# Altium footprint library ERNI THD.PcbLib: 27 footprints (part 2 of 3)
Each footprint in its own frame and in the unit in brackets; x right, y up, seen from the top. Pads: shape width x height; smd on the part's side, far side on the other; paste and mask are expansions set on the pad; w line width, h text height; cw(c..) or ccw(c..) is an arc to the next point about the centre after c.
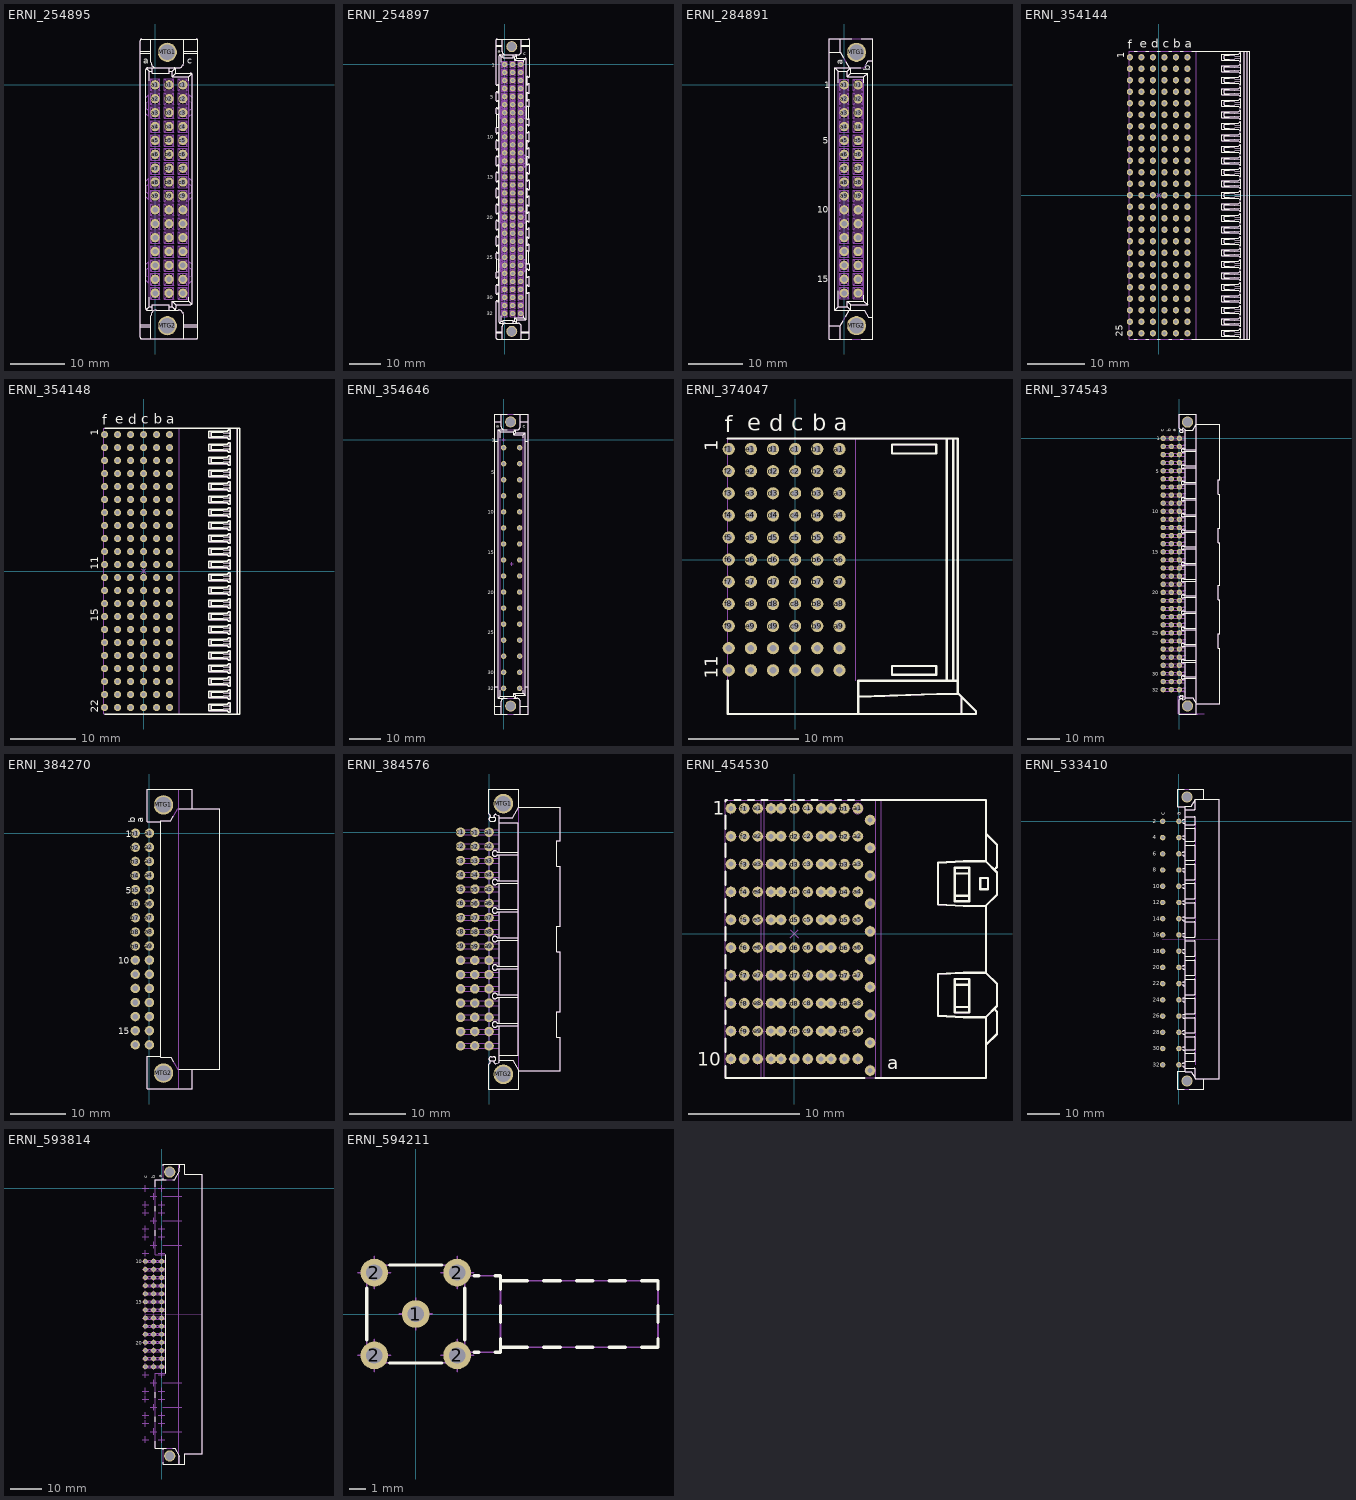
[diagram p1: the footprints below, top view; thin cyan lines are the x and y axes]

## ERNI_254895 [mm] "DIN 41612, Type C/2, Thru-Hole;  Rows a+b+c, 48 Positions, Class 1, Lead 4mm, Pitch 2.54mm, Vertical Female Connector"
height 11.6
pads (50):
  round 1.7 hole 1: a1(0,0) a2(0,-2.54) a3(0,-5.08) a4(0,-7.62) a5(0,-10.16) a6(0,-12.7) a7(0,-15.24) a8(0,-17.78) a9(0,-20.32) a10(0,-22.86) a11(0,-25.4) a12(0,-27.94) a13(0,-30.48) a14(0,-33.02) a15(0,-35.56) a16(0,-38.1) b1(2.54,0) b2(2.54,-2.54) b3(2.54,-5.08) b4(2.54,-7.62) b5(2.54,-10.16) b6(2.54,-12.7) b7(2.54,-15.24) b8(2.54,-17.78) b9(2.54,-20.32) b10(2.54,-22.86) b11(2.54,-25.4) b12(2.54,-27.94) b13(2.54,-30.48) b14(2.54,-33.02) b15(2.54,-35.56) b16(2.54,-38.1) c1(5.08,0) c2(5.08,-2.54) c3(5.08,-5.08) c4(5.08,-7.62) c5(5.08,-10.16) c6(5.08,-12.7) c7(5.08,-15.24) c8(5.08,-17.78) c9(5.08,-20.32) c10(5.08,-22.86) c11(5.08,-25.4) c12(5.08,-27.94) c13(5.08,-30.48) c14(5.08,-33.02) c15(5.08,-35.56) c16(5.08,-38.1)
  round 3.5 / inner round 3.5 / far side round 5.1 hole 2.8: MTG1(2.24,5.95) MTG2(2.24,-44.05)
Top Overlay:
  lines w0.2: -2.71,-44.235 -0.76,-44.235 ; -2.71,-43.882 -0.76,-43.882 ; -2.71,5.784 -0.76,5.784 ; -2.71,6.137 -0.76,6.137 ; -1.597,-41.111 -1.035,-40.549 ; -1.597,3.013 -1.035,2.451 ; -1.035,-38.801 -1.035,-40.549 ; -1.035,0.701 -1.035,2.451 ; -0.76,-46.479 -0.76,-42.199 cw(c0.24,-42.199) 0.24,-41.199 4.24,-41.199 cw(c4.24,-42.199) 5.24,-42.199 5.24,-46.479 ; -0.76,8.381 -0.76,4.101 ccw(c0.24,4.101) 0.24,3.101 ; -0.485,-40.549 -1.035,-40.549 ; -0.485,2.451 -1.035,2.451 ; -0.485,3.103 -0.485,2.101 2.565,2.101 2.565,3.101 ; 2.565,-41.199 2.565,-40.199 -0.485,-40.199 -0.485,-41.199 -1.385,-41.199 cw(c-1.385,-40.899) -1.685,-40.899 -1.685,2.801 cw(c-1.385,2.801) -1.385,3.101 4.24,3.101 ccw(c4.24,4.101) 5.24,4.101 5.24,8.381 ; 2.565,-40.549 3.115,-40.549 ; 2.565,2.451 3.115,2.451 ; 3.465,-41.199 ccw(c3.465,-40.899) 3.765,-40.899 3.765,-40.199 ; 3.465,3.101 cw(c3.465,2.801) 3.765,2.801 3.765,2.101 ; 3.677,-41.111 3.115,-40.549 ; 3.677,3.013 3.115,2.451 ; 5.24,-44.235 7.79,-44.235 ; 5.24,-43.882 7.79,-43.882 ; 5.24,5.784 7.79,5.784 ; 5.24,6.137 7.79,6.137 ; 6.115,-38.801 6.115,-39.549 ; 6.115,0.701 6.115,1.451 ; 6.677,-40.111 6.115,-39.549 ; 6.677,2.013 6.115,1.451 ; 3.115,-40.549 3.115,-39.549 ; 3.115,-39.549 3.765,-40.199 ; 3.115,-39.549 6.115,-39.549 ; 3.115,1.451 3.765,2.101 ; 3.115,1.451 3.115,2.451 ; 3.115,1.451 6.115,1.451 ; 3.765,-40.199 6.465,-40.199 ccw(c6.465,-39.899) 6.765,-39.899 6.765,1.801 ccw(c6.465,1.801) 6.465,2.101 3.765,2.101 ; -2.71,-46.179 ccw(c-2.41,-46.179) -2.41,-46.479 7.49,-46.479 ccw(c7.49,-46.179) 7.79,-46.179 7.79,8.081 ccw(c7.49,8.081) 7.49,8.381 -2.41,8.381 ccw(c-2.41,8.081) -2.71,8.081 -2.71,-46.179
  text "a" at -2.186,3.81 h1.2
  text "c" at 5.915,3.81 h1.2
Mechanical 8:
  drawing of 200 lines, arcs and shapes, not listed
Mechanical 14:
  drawing of 677 lines, arcs and shapes, not listed
  text "a" at -2.186,3.81 h1.2
  text "c" at 5.915,3.81 h1.2
3D body "ERNI_254895.stp": height 11.45, standoff -4, extent -2.71,-46.479 7.79,8.381

## ERNI_254897 [mm] "DIN 41612, Type C,  Thru-Hole; Rows a+b+c, 96 Position, Class 1, Lead 4mm, Pitch 2.54mm, Straight Female Connector"
height 11.6
pads (98):
  round 1.7 hole 1: a1(0,0) a2(0,-2.54) a3(0,-5.08) a4(0,-7.62) a5(0,-10.16) a6(0,-12.7) a7(0,-15.24) a8(0,-17.78) a9(0,-20.32) a10(0,-22.86) a11(0,-25.4) a12(0,-27.94) a13(0,-30.48) a14(0,-33.02) a15(0,-35.56) a16(0,-38.1) a17(0,-40.64) a18(0,-43.18) a19(0,-45.72) a20(0,-48.26) a21(0,-50.8) a22(0,-53.34) a23(0,-55.88) a24(0,-58.42) a25(0,-60.96) a26(0,-63.5) a27(0,-66.04) a28(0,-68.58) a29(0,-71.12) a30(0,-73.66) a31(0,-76.2) a32(0,-78.74) b1(2.54,0) b2(2.54,-2.54) b3(2.54,-5.08) b4(2.54,-7.62) b5(2.54,-10.16) b6(2.54,-12.7) b7(2.54,-15.24) b8(2.54,-17.78) b9(2.54,-20.32) b10(2.54,-22.86) b11(2.54,-25.4) b12(2.54,-27.94) b13(2.54,-30.48) b14(2.54,-33.02) b15(2.54,-35.56) b16(2.54,-38.1) b17(2.54,-40.64) b18(2.54,-43.18) b19(2.54,-45.72) b20(2.54,-48.26) b21(2.54,-50.8) b22(2.54,-53.34) b23(2.54,-55.88) b24(2.54,-58.42) b25(2.54,-60.96) b26(2.54,-63.5) b27(2.54,-66.04) b28(2.54,-68.58) b29(2.54,-71.12) b30(2.54,-73.66) b31(2.54,-76.2) b32(2.54,-78.74) c1(5.08,0) c2(5.08,-2.54) c3(5.08,-5.08) c4(5.08,-7.62) c5(5.08,-10.16) c6(5.08,-12.7) c7(5.08,-15.24) c8(5.08,-17.78) c9(5.08,-20.32) c10(5.08,-22.86) c11(5.08,-25.4) c12(5.08,-27.94) c13(5.08,-30.48) c14(5.08,-33.02) c15(5.08,-35.56) c16(5.08,-38.1) c17(5.08,-40.64) c18(5.08,-43.18) c19(5.08,-45.72) c20(5.08,-48.26) c21(5.08,-50.8) c22(5.08,-53.34) c23(5.08,-55.88) c24(5.08,-58.42) c25(5.08,-60.96) c26(5.08,-63.5) c27(5.08,-66.04) c28(5.08,-68.58) c29(5.08,-71.12) c30(5.08,-73.66) c31(5.08,-76.2) c32(5.08,-78.74)
  round 3.5 / inner round 3.5 / far side round 5.1 hole 2.8: MTG1(2.24,5.63) MTG2(2.24,-84.37)
Top Overlay:
  drawing of 294 lines, arcs and shapes, not listed
  text "a" at -2.151,3.66 h1.2
  text "c" at 5.805,2.935 h1.2
  text "10" at -5.475,-23.46 h1.2
  text "32" at -5.675,-79.365 h1.2
  text "5" at -4.55,-10.835 h1.2
  text "30" at -5.675,-74.285 h1.2
  text "25" at -5.675,-61.585 h1.2
  text "20" at -5.675,-48.885 h1.2
  text "15" at -5.475,-36.135 h1.2
  text "1" at -4.075,-0.675 h1.2
Mechanical 8:
  drawing of 392 lines, arcs and shapes, not listed
Mechanical 14:
  drawing of 1495 lines, arcs and shapes, not listed
  text "a" at -2.151,3.66 h1.2
  text "c" at 5.805,2.935 h1.2
  text "10" at -5.475,-23.46 h1.2
  text "32" at -5.675,-79.365 h1.2
  text "5" at -4.55,-10.835 h1.2
  text "30" at -5.675,-74.285 h1.2
  text "25" at -5.675,-61.585 h1.2
  text "20" at -5.675,-48.885 h1.2
  text "15" at -5.475,-36.135 h1.2
  text "1" at -4.075,-0.675 h1.2
3D body "ERNI_254897.stp": height 11.45, standoff -4, extent -2.71,-86.795 7.79,8.055

## ERNI_284891 [mm] "DIN 41612, Type 2B, Thru-Hole Pressfit Terminations;  Rows a+b, 32 Positions, Performance level 2, Lead 4.5 mm, Pitch 2.54mm, Straight Female Connector"
height 11.6
pads (34):
  round 1.7 hole 1: a1(0,0) a2(0,-2.54) a3(0,-5.08) a4(0,-7.62) a5(0,-10.16) a6(0,-12.7) a7(0,-15.24) a8(0,-17.78) a9(0,-20.32) a10(0,-22.86) a11(0,-25.4) a12(0,-27.94) a13(0,-30.48) a14(0,-33.02) a15(0,-35.56) a16(0,-38.1) b1(2.54,0) b2(2.54,-2.54) b3(2.54,-5.08) b4(2.54,-7.62) b5(2.54,-10.16) b6(2.54,-12.7) b7(2.54,-15.24) b8(2.54,-17.78) b9(2.54,-20.32) b10(2.54,-22.86) b11(2.54,-25.4) b12(2.54,-27.94) b13(2.54,-30.48) b14(2.54,-33.02) b15(2.54,-35.56) b16(2.54,-38.1)
  round 3.5 / inner round 3.5 / far side round 5.1 hole 2.8: MTG1(2.24,5.95) MTG2(2.24,-44.05)
Top Overlay:
  lines w0.2: -2.73,-44.05 -0.71,-44.05 ; -2.73,5.95 -0.71,5.95 ; -1.08,-37.705 -1.08,-40.6 ; -1.08,0.395 -1.08,2.5 ; -0.71,-46.5 -0.71,-44.05 ; -0.71,8.4 -0.71,5.95 ; -0.214,-43.191 -0.71,-44.05 ; -0.214,5.091 -0.71,5.95 ; 0.269,-42.354 0.907,-41.25 3.653,-41.25 4.375,-42.5 5.27,-42.5 ; 0.269,4.254 0.907,3.15 3.025,3.15 ; 1.37,-46.5 -2.73,-46.5 -2.73,8.4 1.37,8.4 ; 3.11,-46.5 5.27,-46.5 5.27,8.4 3.11,8.4 ; 3.62,-38.495 3.62,-39.55 ; 3.62,0.395 3.62,1.45 ; 4.014,3.775 4.375,4.4 5.27,4.4 ; -1.73,-41.25 1.17,-41.25 ; -1.73,-41.25 -1.73,3.15 ; -1.73,-41.25 -1.08,-40.6 ; -1.73,3.15 1.17,3.15 ; -1.73,3.15 -1.08,2.5 ; -1.08,-40.6 0.52,-40.6 ; -1.08,2.5 0.52,2.5 ; 0.52,-40.6 0.52,-39.55 ; 0.52,-40.6 1.17,-41.25 ; 0.52,-39.55 3.62,-39.55 ; 0.52,-39.55 1.17,-40.2 ; 0.52,1.45 0.52,2.5 ; 0.52,1.45 3.62,1.45 ; 0.52,1.45 1.17,2.1 ; 0.52,2.5 1.17,3.15 ; 1.17,-41.25 1.17,-40.2 ; 1.17,-40.2 4.27,-40.2 ; 1.17,2.1 1.17,3.15 ; 1.17,2.1 4.27,2.1 ; 3.62,-39.55 4.27,-40.2 ; 3.62,1.45 4.27,2.1 ; 4.27,-40.2 4.27,2.1
  text "15" at -4.949,-36.13 h1.2
  text "1" at -3.64,-0.625 h1.2
  text "b" at 4.775,2.55 h1.2
  text "a" at -0.275,3.65 h1.2
  text "5" at -3.965,-10.785 h1.2
  text "10" at -4.949,-23.43 h1.2
Mechanical 8:
  lines w0.1: 0,-38.1 0,-37.6 0,-38.1 ; 0,-38.1 0.5,-38.1 0,-38.1 ; 0,-38.1 0,-38.6 0,-38.1 ; 0,-38.1 -0.5,-38.1 0,-38.1 ; 0,0 0,0.5 0,0 ; 0,0 0.5,0 0,0 ; 0,0 0,-0.5 0,0 ; 0,0 -0.5,0 0,0 ; 2.24,-44.05 2.24,-43.55 2.24,-44.05 ; 2.24,-44.05 2.74,-44.05 2.24,-44.05 ; 2.24,-44.05 2.24,-44.55 2.24,-44.05 ; 2.24,-44.05 1.74,-44.05 2.24,-44.05 ; 2.24,5.95 2.24,6.45 2.24,5.95 ; 2.24,5.95 2.74,5.95 2.24,5.95 ; 2.24,5.95 2.24,5.45 2.24,5.95 ; 2.24,5.95 1.74,5.95 2.24,5.95 ; 2.54,-38.1 2.54,-37.6 2.54,-38.1 ; 2.54,-38.1 3.04,-38.1 2.54,-38.1 ; 2.54,-38.1 2.54,-38.6 2.54,-38.1 ; 2.54,-38.1 2.04,-38.1 2.54,-38.1 ; 2.54,0 2.54,0.5 2.54,0 ; 2.54,0 3.04,0 2.54,0 ; 2.54,0 2.54,-0.5 2.54,0 ; 2.54,0 2.04,0 2.54,0
Mechanical 14:
  drawing of 426 lines, arcs and shapes, not listed
  text "15" at -4.949,-36.13 h1.2
  text "10" at -4.949,-23.43 h1.2
  text "5" at -3.965,-10.785 h1.2
  text "a" at -0.275,3.65 h1.2
  text "b" at 4.775,2.55 h1.2
  text "1" at -3.64,-0.625 h1.2
Drill Drawing:
  lines w0.1: -2.73,-39.5 -2.73,1.5 5.27,1.5 5.27,-39.5 -2.73,-39.5
  text "PRESS-FIT TECHNOLOGY diam. 1mm +0.09 -0.06" at -1.325,-37.125 h1
3D body "ERNI_284891.stp": height 11.6, standoff -4.5, extent -2.73,-46.5 5.27,8.4

## ERNI_354144 [mm] "125 Signal Contact in 5 Rows + 50 Ground Shield in 2 Rows, (150 Contacts in 6 Rows a,b,c,d,e,f of 25 positions), Pitch 2 mm,  Press-Fit, Right Angled Ermet Hard Metric Female Connector"
height 11.4
pads (150):
  round 1.1 hole 0.6: A1(5,24) A2(5,22) A3(5,20) A4(5,18) A5(5,16) A6(5,14) A7(5,12) A8(5,10) A9(5,8) A10(5,6) A11(5,4) A12(5,2) A13(5,0) A14(5,-2) A15(5,-4) A16(5,-6) A17(5,-8) A18(5,-10) A19(5,-12) A20(5,-14) A21(5,-16) A22(5,-18) A23(5,-20) A24(5,-22) A25(5,-24) B1(3,24) B2(3,22) B3(3,20) B4(3,18) B5(3,16) B6(3,14) B7(3,12) B8(3,10) B9(3,8) B10(3,6) B11(3,4) B12(3,2) B13(3,0) B14(3,-2) B15(3,-4) B16(3,-6) B17(3,-8) B18(3,-10) B19(3,-12) B20(3,-14) B21(3,-16) B22(3,-18) B23(3,-20) B24(3,-22) B25(3,-24) C1(1,24) C2(1,22) C3(1,20) C4(1,18) C5(1,16) C6(1,14) C7(1,12) C8(1,10) C9(1,8) C10(1,6) C11(1,4) C12(1,2) C13(1,0) C14(1,-2) C15(1,-4) C16(1,-6) C17(1,-8) C18(1,-10) C19(1,-12) C20(1,-14) C21(1,-16) C22(1,-18) C23(1,-20) C24(1,-22) C25(1,-24) D1(-1,24) D2(-1,22) D3(-1,20) D4(-1,18) D5(-1,16) D6(-1,14) D7(-1,12) D8(-1,10) D9(-1,8) D10(-1,6) D11(-1,4) D12(-1,2) D13(-1,0) D14(-1,-2) D15(-1,-4) D16(-1,-6) D17(-1,-8) D18(-1,-10) D19(-1,-12) D20(-1,-14) D21(-1,-16) D22(-1,-18) D23(-1,-20) D24(-1,-22) D25(-1,-24) E1(-3,24) E2(-3,22) E3(-3,20) E4(-3,18) E5(-3,16) E6(-3,14) E7(-3,12) E8(-3,10) E9(-3,8) E10(-3,6) E11(-3,4) E12(-3,2) E13(-3,0) E14(-3,-2) E15(-3,-4) E16(-3,-6) E17(-3,-8) E18(-3,-10) E19(-3,-12) E20(-3,-14) E21(-3,-16) E22(-3,-18) E23(-3,-20) E24(-3,-22) E25(-3,-24) F1(-5,24) F2(-5,22) F3(-5,20) F4(-5,18) F5(-5,16) F6(-5,14) F7(-5,12) F8(-5,10) F9(-5,8) F10(-5,6) F11(-5,4) F12(-5,2) F13(-5,0) F14(-5,-2) F15(-5,-4) F16(-5,-6) F17(-5,-8) F18(-5,-10) F19(-5,-12) F20(-5,-14) F21(-5,-16) F22(-5,-18) F23(-5,-20) F24(-5,-22) F25(-5,-24)
Top Overlay:
  drawing of 490 lines, arcs and shapes, not listed
  text "1" at -5.975,23.8 h1.2
  text "f" at -5.363,25.5 h1.5
  text "b" at 2.567,25.65 h1.5
  text "c" at 0.667,25.667 h1.5
  text "d" at -1.333,25.625 h1.5
  text "e" at -3.333,25.667 h1.5
  text "a" at 4.492,25.642 h1.5
  text "25" at -6.25,-24.625 h1.2
Mechanical 8:
  drawing of 606 lines, arcs and shapes, not listed
  text "PCB EDGE" at 8.005,-5.25 h1.2
Mechanical 14:
  drawing of 481 lines, arcs and shapes, not listed
  text "1" at -5.975,23.8 h1.2
  text "f" at -5.363,25.5 h1.5
  text "e" at -3.333,25.667 h1.5
  text "d" at -1.333,25.625 h1.5
  text "c" at 0.667,25.667 h1.5
  text "b" at 2.567,25.65 h1.5
  text "a" at 4.492,25.642 h1.5
  text "25" at -6.25,-24.625 h1.2
Drill Drawing:
  lines w0.1: -6.3,-24.95 6.125,-24.95 6.125,24.95 -6.3,24.95 -6.3,-24.95
  text "PRESS-FIT TECHNOLOGY diam. 0.6mm +/-0.05" at 7.55,-19 h1
3D body "ERNI_354144.stp": height 8.13, standoff -3.7, extent -5.11,-25 15.8,25

## ERNI_354148 [mm] "110 Signal Contacts in 5 Rows + 22 Ground Shield in 1 Rows, (132 Contacts in 6 Rows a,b,c,d,e,f of 22 positions), Pitch 2 mm,  Press-Fit, Ermet Hard Metric Type B22 Right Angle Female Connector"
height 11.4
pads (132):
  round 1.1 hole 0.6: a1(4,21) a2(4,19) a3(4,17) a4(4,15) a5(4,13) a6(4,11) a7(4,9) a8(4,7) a9(4,5) a10(4,3) a11(4,1) a12(4,-1) a13(4,-3) a14(4,-5) a15(4,-7) a16(4,-9) a17(4,-11) a18(4,-13) a19(4,-15) a20(4,-17) a21(4,-19) a22(4,-21) b1(2,21) b2(2,19) b3(2,17) b4(2,15) b5(2,13) b6(2,11) b7(2,9) b8(2,7) b9(2,5) b10(2,3) b11(2,1) b12(2,-1) b13(2,-3) b14(2,-5) b15(2,-7) b16(2,-9) b17(2,-11) b18(2,-13) b19(2,-15) b20(2,-17) b21(2,-19) b22(2,-21) c1(0,21) c2(0,19) c3(0,17) c4(0,15) c5(0,13) c6(0,11) c7(0,9) c8(0,7) c9(0,5) c10(0,3) c11(0,1) c12(0,-1) c13(0,-3) c14(0,-5) c15(0,-7) c16(0,-9) c17(0,-11) c18(0,-13) c19(0,-15) c20(0,-17) c21(0,-19) c22(0,-21) d1(-2,21) d2(-2,19) d3(-2,17) d4(-2,15) d5(-2,13) d6(-2,11) d7(-2,9) d8(-2,7) d9(-2,5) d10(-2,3) d11(-2,1) d12(-2,-1) d13(-2,-3) d14(-2,-5) d15(-2,-7) d16(-2,-9) d17(-2,-11) d18(-2,-13) d19(-2,-15) d20(-2,-17) d21(-2,-19) d22(-2,-21) e1(-4,21) e2(-4,19) e3(-4,17) e4(-4,15) e5(-4,13) e6(-4,11) e7(-4,9) e8(-4,7) e9(-4,5) e10(-4,3) e11(-4,1) e12(-4,-1) e13(-4,-3) e14(-4,-5) e15(-4,-7) e16(-4,-9) e17(-4,-11) e18(-4,-13) e19(-4,-15) e20(-4,-17) e21(-4,-19) e22(-4,-21) f1(-6,21) f2(-6,19) f3(-6,17) f4(-6,15) f5(-6,13) f6(-6,11) f7(-6,9) f8(-6,7) f9(-6,5) f10(-6,3) f11(-6,1) f12(-6,-1) f13(-6,-3) f14(-6,-5) f15(-6,-7) f16(-6,-9) f17(-6,-11) f18(-6,-13) f19(-6,-15) f20(-6,-17) f21(-6,-19) f22(-6,-21)
Top Overlay:
  drawing of 334 lines, arcs and shapes, not listed
  text "11" at -6.975,0.217 h1.2
  text "1" at -6.975,20.8 h1.2
  text "f" at -6.363,22.5 h1.5
  text "b" at 1.567,22.65 h1.5
  text "c" at -0.333,22.667 h1.5
  text "d" at -2.333,22.625 h1.5
  text "e" at -4.333,22.667 h1.5
  text "a" at 3.492,22.642 h1.5
  text "22" at -6.975,-21.786 h1.2
  text "15" at -6.975,-7.783 h1.2
Mechanical 8:
  drawing of 174 lines, arcs and shapes, not listed
  text "PCB EDGE" at 7.005,-4.25 h1.2
Mechanical 14:
  drawing of 339 lines, arcs and shapes, not listed
  text "1" at -6.975,20.8 h1.2
  text "11" at -6.975,0.217 h1.2
  text "f" at -6.363,22.5 h1.5
  text "e" at -4.333,22.667 h1.5
  text "d" at -2.333,22.625 h1.5
  text "c" at -0.333,22.667 h1.5
  text "b" at 1.567,22.65 h1.5
  text "a" at 3.492,22.642 h1.5
  text "22" at -6.975,-21.786 h1.2
  text "15" at -6.975,-7.783 h1.2
Drill Drawing:
  lines w0.1: -6.975,-19.3 -6.975,-22 5.225,-22 5.225,21.95 -6.975,21.95 -6.975,19.075
  text "PRESS-FIT TECHNOLOGY diam. 0.6mm +/-0.05" at -7.25,-17.175 h1
3D body "ERNI_354148.stp": height 8.12, standoff -3.7, extent -6.11,-22 14.8,21.97

## ERNI_354646 [mm] "DIN 41612, Type D, Thru-Hole Pressfit Termination; Rows a+c, 32 Position, Performance level 2, Lead 4.5mm, Pitch 5.08mm, Straight Female Connector"
height 11.6
pads (34):
  round 1.7 hole 1: a2(0,-2.54) a4(0,-7.62) a6(0,-12.7) a8(0,-17.78) a10(0,-22.86) a12(0,-27.94) a14(0,-33.02) a16(0,-38.1) a18(0,-43.18) a20(0,-48.26) a22(0,-53.34) a24(0,-58.42) a26(0,-63.5) a28(0,-68.58) a30(0,-73.66) a32(0,-78.74) c2(5.08,-2.54) c4(5.08,-7.62) c6(5.08,-12.7) c8(5.08,-17.78) c10(5.08,-22.86) c12(5.08,-27.94) c14(5.08,-33.02) c16(5.08,-38.1) c18(5.08,-43.18) c20(5.08,-48.26) c22(5.08,-53.34) c24(5.08,-58.42) c26(5.08,-63.5) c28(5.08,-68.58) c30(5.08,-73.66) c32(5.08,-78.74)
  round 3.5 / inner round 3.5 / far side round 5.1 hole 2.8: MTG1(2.24,5.63) MTG2(2.24,-84.37)
Top Overlay:
  lines w0.2: -2.76,-84.47 -0.76,-84.47 ; -2.76,-78.27 -1.71,-78.27 ; -2.76,-0.47 -1.71,-0.47 ; -2.76,5.73 -0.76,5.73 ; -1.11,-79.315 -1.11,-81.27 ; -1.11,0.575 -1.11,2.53 ; -0.76,-86.87 -0.76,-82.87 cw(c0.24,-82.87) 0.24,-81.87 1.22,-81.87 -1.71,-81.87 ; -0.76,8.13 -0.76,4.13 ccw(c0.24,4.13) 0.24,3.13 1.22,3.13 -1.71,3.13 ; 1.22,-86.87 -2.76,-86.87 -2.76,8.13 1.22,8.13 ; 3.26,-86.87 7.84,-86.87 7.84,8.13 3.26,8.13 ; 5.24,-86.87 5.24,-82.87 ccw(c4.24,-82.87) 4.24,-81.87 3.26,-81.87 3.79,-81.87 ; 5.24,-84.47 7.84,-84.47 ; 5.24,5.73 7.84,5.73 ; 5.24,8.13 5.24,4.13 cw(c4.24,4.13) 4.24,3.13 3.26,3.13 3.79,3.13 ; 6.19,-79.315 6.19,-80.27 ; 6.19,0.575 6.19,1.53 ; 6.79,-78.27 7.84,-78.27 ; 6.79,-0.47 7.84,-0.47 ; -1.71,-81.87 -1.11,-81.27 ; -1.71,-81.87 -1.71,3.13 ; -1.71,3.13 -1.11,2.53 ; -1.11,-81.27 3.19,-81.27 ; -1.11,2.53 3.19,2.53 ; 3.19,-81.27 3.79,-81.87 ; 3.19,-81.27 3.19,-80.27 ; 3.19,-80.27 3.79,-80.87 ; 3.19,-80.27 6.19,-80.27 ; 3.19,1.53 3.79,2.13 ; 3.19,1.53 6.19,1.53 ; 3.19,1.53 3.19,2.53 ; 3.19,2.53 3.79,3.13 ; 3.79,-81.87 3.79,-80.87 ; 3.79,-80.87 6.79,-80.87 ; 3.79,2.13 6.79,2.13 ; 3.79,2.13 3.79,3.13 ; 6.19,-80.27 6.79,-80.87 ; 6.19,1.53 6.79,2.13 ; 6.79,-80.87 6.79,2.13
  text "1" at -3.725,-0.725 h1.2
  text "15" at -5.05,-36.235 h1.2
  text "20" at -5.05,-48.935 h1.2
  text "25" at -5.05,-61.635 h1.2
  text "30" at -5.05,-74.335 h1.2
  text "10" at -5.05,-23.535 h1.2
  text "5" at -3.925,-10.885 h1.2
  text "32" at -5.05,-79.415 h1.2
  text "a" at -2.286,3.81 h1.2
  text "c" at 6.032,3.81 h1.2
Mechanical 8:
  lines w0.1: -0.5,-78.74 0,-78.74 ; -0.5,-73.66 0,-73.66 ; -0.5,-2.54 0,-2.54 ; -0.5,0 0,0 ; 0,-79.24 0,-78.74 ; 0,-78.24 0,-78.74 ; 0,-74.16 0,-73.66 ; 0,-73.16 0,-73.66 ; 0,-3.04 0,-2.54 ; 0,-2.04 0,-2.54 ; 0,-0.5 0,0 ; 0,0.5 0,0 ; 0.5,-78.74 0,-78.74 ; 0.5,-73.66 0,-73.66 ; 0.5,-2.54 0,-2.54 ; 0.5,0 0,0 ; 1.74,-84.37 2.24,-84.37 ; 1.74,5.63 2.24,5.63 ; 2.04,-39.37 2.54,-39.37 ; 2.24,-84.87 2.24,-84.37 ; 2.24,-83.87 2.24,-84.37 ; 2.24,5.13 2.24,5.63 ; 2.24,6.13 2.24,5.63 ; 2.54,-39.87 2.54,-39.37 ; 2.54,-38.87 2.54,-39.37 ; 2.74,-84.37 2.24,-84.37 ; 2.74,5.63 2.24,5.63 ; 3.04,-39.37 2.54,-39.37 ; 4.58,-78.74 5.08,-78.74 ; 4.58,-73.66 5.08,-73.66 ; 4.58,-2.54 5.08,-2.54 ; 5.08,-79.24 5.08,-78.74 ; 5.08,-78.24 5.08,-78.74 ; 5.08,-74.16 5.08,-73.66 ; 5.08,-73.16 5.08,-73.66 ; 5.08,-3.04 5.08,-2.54 ; 5.08,-2.04 5.08,-2.54 ; 5.58,-78.74 5.08,-78.74 ; 5.58,-73.66 5.08,-73.66 ; 5.58,-2.54 5.08,-2.54
Mechanical 14:
  circle w0.1: c2.24,5.63 r1.425
  circle w0.1: c2.24,-84.37 r1.425
  circle w0.1: c2.24,5.63 r1.4
  circle w0.1: c2.24,-84.37 r1.4
  lines w0.1: -2.76,-84.47 -0.76,-84.47 ; -2.76,-78.27 -1.71,-78.27 ; -2.76,-0.47 -1.71,-0.47 ; -2.76,5.73 -0.76,5.73 ; -0.76,-86.87 -0.76,-82.87 cw(c0.24,-82.87) 0.24,-81.87 4.24,-81.87 cw(c4.24,-82.87) 5.24,-82.87 5.24,-86.87 ; -0.76,8.13 -0.76,4.13 ccw(c0.24,4.13) 0.24,3.13 4.24,3.13 ccw(c4.24,4.13) 5.24,4.13 5.24,8.13 ; 5.24,-84.47 7.84,-84.47 ; 5.24,5.73 7.84,5.73 ; 6.79,-78.27 7.84,-78.27 ; 6.79,-0.47 7.84,-0.47 ; -1.71,-81.87 -1.11,-81.27 ; -1.71,-81.87 -1.71,3.13 ; -1.71,-81.87 3.79,-81.87 ; -1.71,3.13 -1.11,2.53 ; -1.71,3.13 3.79,3.13 ; -1.11,-81.27 -1.11,2.53 ; -1.11,-81.27 3.19,-81.27 ; -1.11,2.53 3.19,2.53 ; 3.19,-81.27 3.79,-81.87 ; 3.19,-81.27 3.19,-80.27 ; 3.19,-80.27 3.79,-80.87 ; 3.19,-80.27 6.19,-80.27 ; 3.19,1.53 3.79,2.13 ; 3.19,1.53 6.19,1.53 ; 3.19,1.53 3.19,2.53 ; 3.19,2.53 3.79,3.13 ; 3.79,-81.87 3.79,-80.87 ; 3.79,-80.87 6.79,-80.87 ; 3.79,2.13 6.79,2.13 ; 3.79,2.13 3.79,3.13 ; 6.19,-80.27 6.79,-80.87 ; 6.19,-80.27 6.19,1.53 ; 6.19,1.53 6.79,2.13 ; 6.79,-80.87 6.79,2.13 ; -2.76,-86.87 -2.76,8.13 7.84,8.13 7.84,-86.87 -2.76,-86.87
  text "30" at -5.05,-74.335 h1.2
  text "25" at -5.05,-61.635 h1.2
  text "20" at -5.05,-48.935 h1.2
  text "15" at -5.05,-36.235 h1.2
  text "10" at -5.05,-23.535 h1.2
  text "5" at -3.925,-10.885 h1.2
  text "32" at -5.05,-79.415 h1.2
  text "a" at -2.286,3.81 h1.2
  text "c" at 6.032,3.81 h1.2
  text "1" at -3.725,-0.725 h1.2
Drill Drawing:
  lines w0.1: -2.54,-58.42 -2.54,-81.28 7.62,-81.28 7.62,0 -2.54,0 -2.54,-20.32
  text "PRESS-FIT TECHNOLOGY diam. 1mm +0.09 -0.06" at -1.905,-56.515 h1
3D body "ERNI_354646.stp": height 11.5, standoff -4.3, extent -2.76,-86.87 7.84,8.13

## ERNI_374047 [mm] "55 Signal Contacts in 5 Rows + 11 Ground Shield in 1 Rows, (66 Contacts in 6 Rows a,b,c,d,e,f of 11 positions), Pitch 2 mm,  Press-Fit, Ermet Hard Metric Type C Right Angle Female Connector"
height 12.25
pads (66):
  round 1.1 hole 0.6: a1(4,10) a2(4,8) a3(4,6) a4(4,4) a5(4,2) a6(4,0) a7(4,-2) a8(4,-4) a9(4,-6) a10(4,-8) a11(4,-10) b1(2,10) b2(2,8) b3(2,6) b4(2,4) b5(2,2) b6(2,0) b7(2,-2) b8(2,-4) b9(2,-6) b10(2,-8) b11(2,-10) c1(0,10) c2(0,8) c3(0,6) c4(0,4) c5(0,2) c6(0,0) c7(0,-2) c8(0,-4) c9(0,-6) c10(0,-8) c11(0,-10) d1(-2,10) d2(-2,8) d3(-2,6) d4(-2,4) d5(-2,2) d6(-2,0) d7(-2,-2) d8(-2,-4) d9(-2,-6) d10(-2,-8) d11(-2,-10) e1(-4,10) e2(-4,8) e3(-4,6) e4(-4,4) e5(-4,2) e6(-4,0) e7(-4,-2) e8(-4,-4) e9(-4,-6) e10(-4,-8) e11(-4,-10) f1(-6,10) f2(-6,8) f3(-6,6) f4(-6,4) f5(-6,2) f6(-6,0) f7(-6,-2) f8(-6,-4) f9(-6,-6) f10(-6,-8) f11(-6,-10)
Top Overlay:
  lines w0.2: -6.1,-10.95 -6.1,-13.95 16.35,-13.95 16.35,-13.7 14.8,-12.15 12.85,-12.15 5.7,-12.4 ; -6.1,10.95 14.7,10.95 14.7,-12.15 ; 5.7,-13.95 5.7,-10.95 14.7,-10.95 ; 13.7,-10.95 13.7,10.95 ; 14.3,-10.95 14.3,10.95 ; 15.025,-13.95 15.025,-12.375 ; 8.75,-10.4 8.75,-9.6 12.75,-9.6 12.75,-10.4 8.75,-10.4 ; 8.75,9.6 12.75,9.6 12.75,10.4 8.75,10.4 8.75,9.6
  text "11" at -6.975,-10.783 h1.2
  text "1" at -6.975,9.8 h1.2
  text "f" at -6.363,11.5 h1.5
  text "b" at 1.567,11.65 h1.5
  text "c" at -0.333,11.667 h1.5
  text "d" at -2.333,11.625 h1.5
  text "e" at -4.333,11.667 h1.5
  text "a" at 3.492,11.642 h1.5
Mechanical 8:
  lines w0.1: -6.5,-10 -6,-10 ; -6.5,-8 -6,-8 ; -6.5,-6 -6,-6 ; -6.5,-4 -6,-4 ; -6.5,-2 -6,-2 ; -6.5,0 -6,0 ; -6.5,2 -6,2 ; -6.5,4 -6,4 ; -6.5,6 -6,6 ; -6.5,8 -6,8 ; -6.5,10 -6,10 ; -6,-10.5 -6,-10 ; -6,-9.5 -6,-10 ; -6,-8.5 -6,-8 ; -6,-7.5 -6,-8 ; -6,-6.5 -6,-6 ; -6,-5.5 -6,-6 ; -6,-4.5 -6,-4 ; -6,-3.5 -6,-4 ; -6,-2.5 -6,-2 ; -6,-1.5 -6,-2 ; -6,-0.5 -6,0 ; -6,0.5 -6,0 ; -6,1.5 -6,2 ; -6,2.5 -6,2 ; -6,3.5 -6,4 ; -6,4.5 -6,4 ; -6,5.5 -6,6 ; -6,6.5 -6,6 ; -6,7.5 -6,8 ; -6,8.5 -6,8 ; -6,9.5 -6,10 ; -6,10.5 -6,10 ; -5.5,-10 -6,-10 ; -5.5,-8 -6,-8 ; -5.5,-6 -6,-6 ; -5.5,-4 -6,-4 ; -5.5,-2 -6,-2 ; -5.5,0 -6,0 ; -5.5,2 -6,2 ; -5.5,4 -6,4 ; -5.5,6 -6,6 ; -5.5,8 -6,8 ; -5.5,10 -6,10 ; -4.5,-10 -4,-10 ; -4.5,10 -4,10 ; -4,-10.5 -4,-10 ; -4,-9.5 -4,-10 ; -4,9.5 -4,10 ; -4,10.5 -4,10 ; -3.5,-10 -4,-10 ; -3.5,10 -4,10 ; -2.5,-10 -2,-10 ; -2.5,10 -2,10 ; -2,-10.5 -2,-10 ; -2,-9.5 -2,-10 ; -2,9.5 -2,10 ; -2,10.5 -2,10 ; -1.5,-10 -2,-10 ; -1.5,10 -2,10 ; -0.5,-10 0,-10 ; -0.5,0 0,0 ; -0.5,10 0,10 ; 0,-10.5 0,-10 ; 0,-9.5 0,-10 ; 0,-0.5 0,0 ; 0,0.5 0,0 ; 0,9.5 0,10 ; 0,10.5 0,10 ; 0.5,-10 0,-10 ; 0.5,0 0,0 ; 0.5,10 0,10 ; 1.5,-10 2,-10 ; 1.5,10 2,10 ; 2,-10.5 2,-10 ; 2,-9.5 2,-10 ; 2,9.5 2,10 ; 2,10.5 2,10 ; 2.5,-10 2,-10 ; 2.5,10 2,10 ; 3.5,-10 4,-10 ; 3.5,10 4,10 ; 4,-10.5 4,-10 ; 4,-9.5 4,-10 ; 4,9.5 4,10 ; 4,10.5 4,10 ; 4.5,-10 4,-10 ; 4.5,10 4,10 ; 5.5,-10.95 5.5,0 5.5,10.95